# Altium footprint library THT.PcbLib: 60 footprints (part 1 of 4)
Each footprint in its own frame and in the unit in brackets; x right, y up, seen from the top. Pads: shape width x height; smd on the part's side, far side on the other; paste and mask are expansions set on the pad; w line width, h text height; cw(c..) or ccw(c..) is an arc to the next point about the centre after c.
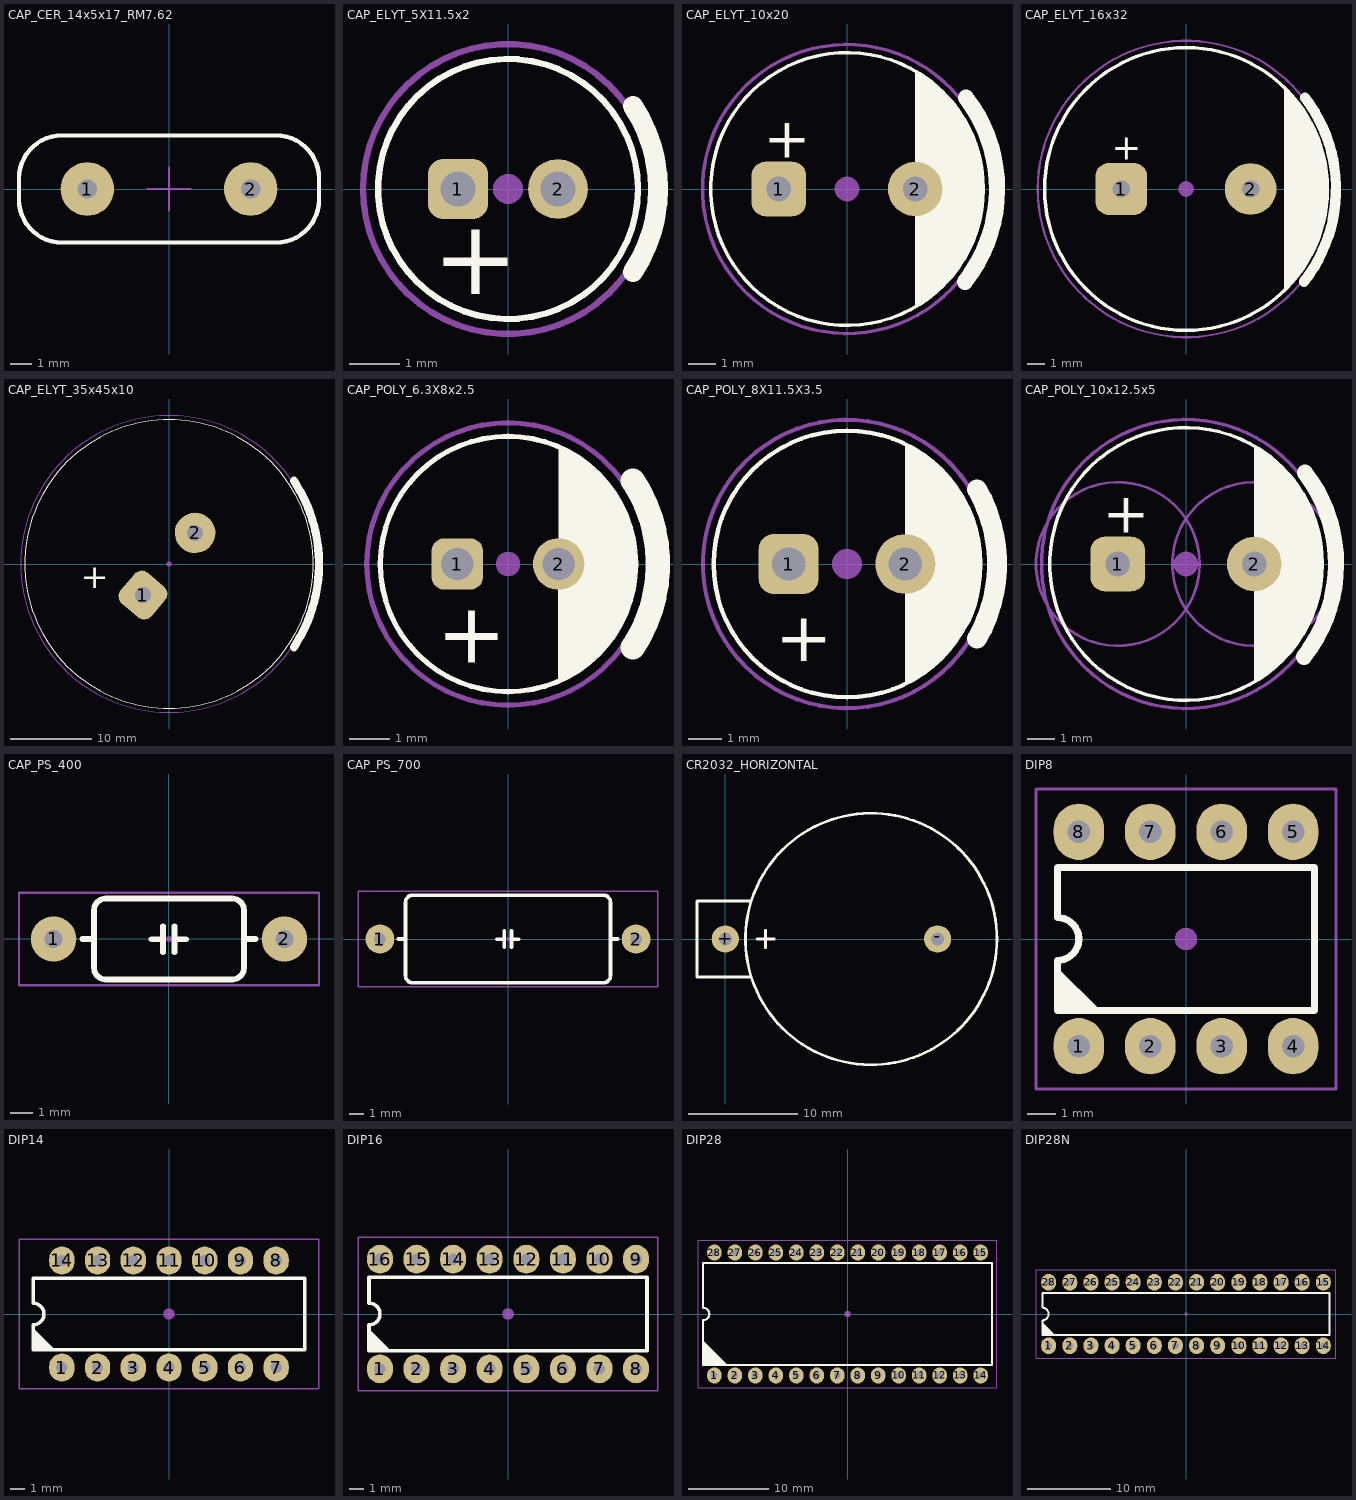
[diagram p0: the footprints below, top view; thin cyan lines are the x and y axes]

## CAP_CER_14x5x17_RM7.62 [mm] "Capacitor Radial Button, Pin spacing 7.62mm - Body Diameter  14mm X Body Width 5mm X Body Height 17mm"
height 17
pads (2):
  round 2.5 hole 0.9: 1(-3.81,0) 2(3.81,0)
Top Overlay:
  lines w0.2: -7,-0.5 ccw(c-5,-0.5) -5,-2.5 5,-2.5 ccw(c5,-0.5) 7,-0.5 7,0.5 ccw(c5,0.5) 5,2.5 -5,2.5 ccw(c-5,0.5) -7,0.5 -7,-0.5
Mechanical 8:
  lines w0.1: -4.81,0 -3.81,0 ; -3.81,-1 -3.81,0 ; -3.81,1 -3.81,0 ; -2.81,0 -3.81,0 ; -1,0 0,0 ; 0,-1 0,0 ; 0,1 0,0 ; 1,0 0,0 ; 2.81,0 3.81,0 ; 3.81,-1 3.81,0 ; 3.81,1 3.81,0 ; 4.81,0 3.81,0
Mechanical 14:
  lines w0.1: -7,-0.5 ccw(c-5,-0.5) -5,-2.5 5,-2.5 ccw(c5,-0.5) 7,-0.5 7,0.5 ccw(c5,0.5) 5,2.5 -5,2.5 ccw(c-5,0.5) -7,0.5 -7,-0.5
3D body "CAPRB_MURATA_DE2F3KY103MA3BM02.stp": height 17, standoff -3.6, extent -7,-2.5 7,2.5

## CAP_ELYT_5X11.5x2 [mm]
height 1.6
pads (2):
  rrect50% 1.2x1.2 / inner rrect50% 1.2x1.2 / far side rrect50% 1.4x2 hole 0.7: 1(-1,0)
  round 1.2 / inner round 1.2 / far side oval 1.4x2 hole 0.7: 2(1,0)
Top Overlay:
  circle w0.127: c0,0 r2.6
  lines w0.4: 2.496,-1.664 ccw(c0,0) 2.496,1.664
  text "+" at -1.5,-2.1 h1.5
Mechanical 15:
  circle w0.3: c0,0 r0.15
  circle w0.127: c0,0 r2.9
3D body "User Library-CE_R100_D200_H460.step": height 2.7, standoff -12.4, extent -2.54,-2.538 2.54,2.538

## CAP_ELYT_10x20 [mm]
pads (2):
  rrect50% 2x2 hole 0.9: 1(-2.5,0)
  round 2 hole 0.9: 2(2.5,0)
Top Overlay:
  circle w0.127: c0,0 r5
  region: 2.5,4.3 2.6,4.3 2.9,4.1 3.1,4 4,3.1 4,2.9 4.4,2.5 4.4,2.3 4.6,2.1 4.6,1.8 4.8,1.6 4.8,1.2 4.9,1.1 5,0.7 5,-0.7 4.9,-0.8 4.9,-1.2 4.8,-1.3 4.8,-1.6 4.6,-1.8 4.6,-2.1 4.4,-2.3 4.4,-2.5 4.3,-2.5 4.2,-2.6 4.2,-2.8 3.8,-3.2 3.8,-3.3 3.7,-3.3 2.9,-4.1 2.8,-4.1 2.5,-4.4
  lines w0.6: 4.325,-3.398 ccw(c0,0) 4.363,3.349
  text "+" at -3.048,1.143 h1.5
Mechanical 15:
  circle w0.127: c0,0 r5.3
  circle w0.5: c0,0 r0.2
3D body "User Library-CapAluRadial_D100H200.STEP": height 2.5, standoff -22.5, extent -5.25,-5.249 5.25,5.249

## CAP_ELYT_16x32 [mm]
pads (2):
  rrect50% 3x3 hole 1: 1(-3.75,0)
  round 3 hole 1: 2(3.75,0)
Top Overlay:
  circle w0.2: c0,0 r8.2
  region: 5.7,-5.9 5.892,-5.708 6.165,-5.435 6.657,-4.836 7.087,-4.192 7.452,-3.509 7.748,-2.794 7.973,-2.053 8.124,-1.293 8.2,-0.523 8.2,-0.135 8.2,0.284 8.118,1.118 7.954,1.941 7.711,2.744 7.39,3.518 6.994,4.258 6.529,4.955 5.997,5.603 5.7,5.9
  lines w0.6: 6.841,-5.375 ccw(c0,0) 6.902,5.297
  text "+" at -4.3,1.7 h1.5
Mechanical 15:
  circle w0.5: c0,0 r0.2
  circle w0.127: c0,0 r8.6
3D body "User Library-CapAluRadial_D160H315.STEP": height 2.5, standoff -34, extent -8.25,-8.25 8.25,8.25

## CAP_ELYT_35x45x10 [mm]
height 1.6
pads (2):
  rrect50% 5x5 hole 2 rot 50: 1(-3.214,-3.83)
  round 5 hole 2: 2(3.214,3.83)
Top Overlay:
  circle w0.127: c0,0 r17.8
  lines w1: 15.393,-10.262 ccw(c0,0) 15.393,10.262
  text "+" at -10.9,-3 h3
Mechanical 15:
  circle w0.127: c0,0 r18.301
  circle w0.3: c0,0 r0.15
3D body "User Library-Snap-in 35X45-P10.step": height 3.92, standoff -45.7, extent -17.78,-17.78 17.78,17.78

## CAP_POLY_6.3X8x2.5 [mm]
height 1.6
pads (2):
  rrect50% 1.27x1.27 / inner rrect50% 1.27x1.27 / far side rrect50% 1.778x1.778 hole 0.8: 1(-1.25,0)
  round 1.27 / inner round 1.27 / far side round 1.778 hole 0.8: 2(1.25,0)
Top Overlay:
  circle w0.127: c0,0 r3.15
  region: 1.25,2.89 1.295,2.845 1.397,2.845 1.524,2.718 1.626,2.718 1.803,2.54 1.905,2.54 2.54,1.905 2.54,1.803 2.743,1.6 2.743,1.473 2.896,1.321 2.896,1.194 2.997,1.092 2.997,0.813 3.124,0.686 3.124,-0.66 3.023,-0.762 3.023,-1.041 2.87,-1.194 2.87,-1.397 2.642,-1.626 2.642,-1.829 1.93,-2.54 1.803,-2.54 1.575,-2.769 1.422,-2.769 1.245,-2.946 1.27,-2.896 1.245,-2.87
  lines w0.6: 3.079,-2.052 ccw(c0,0) 3.079,2.052
  text "+" at -1.753,-2.438 h1.5
Mechanical 15:
  circle w0.127: c0,0 r3.483
  circle w0.3: c0,0 r0.15
3D body "User Library-CAPPR250-630x1000_100uF_16V.STEP": height 2.3, standoff -10.81, extent -3.15,-3.15 3.15,3.15

## CAP_POLY_8X11.5X3.5 [mm] "Polarized capacitors, Aluminum Electrolytic Capacitors, 2-Leads, Body 8x11.5x3.5x0.5"
height 11.5
pads (2):
  rrect50% 1.8x1.8 / inner rrect50% 1.4x1.4 / far side rrect50% 2.2x2.2 hole 1: 1(-1.75,0)
  round 1.8 / inner round 1.4 / far side round 2.2 hole 1: 2(1.75,0)
Top Overlay:
  circle w0.127: c0,0 r4
  region: 1.75,-3.556 1.778,-3.556 2.667,-3.048 3.302,-2.286 3.393,-2.184 3.553,-1.964 3.691,-1.729 3.806,-1.482 3.895,-1.225 3.959,-0.96 3.997,-0.69 4.008,-0.418 4,-0.282 4,0.282 3.999,0.439 3.966,0.752 3.903,1.06 3.81,1.361 3.687,1.651 3.537,1.927 3.361,2.188 3.16,2.429 3.048,2.54 2.667,3.048 1.778,3.556 1.771,3.549 1.761,3.534 1.754,3.516 1.75,3.498 1.75,3.488
  lines w0.6: 3.907,-2.233 ccw(c0,0) 3.907,2.233
  text "+" at -2.159,-2.921 h1.5
Mechanical 15:
  circle w0.5: c0,0 r0.2
  circle w0.127: c0,0 r4.326
3D body "User Library-CAPPR350-800x1150_270uF_16V.STEP": height 2.3, standoff -12.31, extent -4,-4 4,4

## CAP_POLY_10x12.5x5 [mm]
pads (2):
  rrect50% 2x2 hole 0.9: 1(-2.5,0)
  round 2 hole 0.9: 2(2.5,0)
Top Overlay:
  circle w0.127: c0,0 r5
  region: 2.5,4.3 2.6,4.3 2.9,4.1 3.1,4 4,3.1 4,2.9 4.4,2.5 4.4,2.3 4.6,2.1 4.6,1.8 4.8,1.6 4.8,1.2 4.9,1.1 5,0.7 5,-0.7 4.9,-0.8 4.9,-1.2 4.8,-1.3 4.8,-1.6 4.6,-1.8 4.6,-2.1 4.4,-2.3 4.4,-2.5 4.3,-2.5 4.2,-2.6 4.2,-2.8 3.8,-3.2 3.8,-3.3 3.7,-3.3 2.9,-4.1 2.8,-4.1 2.5,-4.4
  lines w0.6: 4.325,-3.398 ccw(c0,0) 4.363,3.349
  text "+" at -3.048,1.143 h1.5
Mechanical 2:
  circle w0.1: c-2.5,0 r3
  circle w0.1: c2.5,0 r3
Mechanical 15:
  circle w0.5: c0,0 r0.2
  circle w0.127: c0,0 r5.3
3D body "User Library-CAPPR500-1000x1200_330uF_16V.STEP": height 2.3, standoff -12.81, extent -5,-5 5,5

## CAP_PS_400 [mm]
pads (3):
  round 0.254 on Mech15: 0(0,0)
  round 2 hole 0.8: 1(-5.08,0) 2(5.08,0)
Top Overlay:
  lines w0.254: -3.81,0 -3.302,0 ; -0.773,-0.013 -0.265,-0.013 ; -0.265,-0.584 -0.265,0.559 ; 0.243,-0.584 0.243,0.559 ; 0.243,-0.013 0.751,-0.013 ; 3.81,0 3.302,0 ; 3.302,0 3.302,1.27 ccw(c2.794,1.27) 2.794,1.778 -2.794,1.778 ccw(c-2.794,1.27) -3.302,1.27 -3.302,-1.27 ccw(c-2.794,-1.27) -2.794,-1.778 2.794,-1.778 ccw(c2.794,-1.27) 3.302,-1.27 3.302,0
Mechanical 15:
  lines w0.1: -6.604,-2.032 -6.604,2.032 6.604,2.032 6.604,-2.032 -4.826,-2.032 -6.604,-2.032
3D body "User Library-Capacitor no pol axial 0_4in pitch.step": height 3.42, standoff -4.4, extent -5.335,-1.609 5.335,1.609

## CAP_PS_700 [mm]
pads (3):
  round 0.254 on Mech15: 0(0,0)
  round 2 hole 0.8: 1(-8.89,0) 2(8.89,0)
Top Overlay:
  lines w0.254: -7.62,0 -7.112,0 ; -0.773,-0.013 -0.265,-0.013 ; -0.265,-0.584 -0.265,0.559 ; 0.243,-0.584 0.243,0.559 ; 0.243,-0.013 0.751,-0.013 ; 7.62,0 7.112,0 ; 7.112,0 7.112,2.54 ccw(c6.604,2.54) 6.604,3.048 -6.604,3.048 ccw(c-6.604,2.54) -7.112,2.54 -7.112,-2.54 ccw(c-6.604,-2.54) -6.604,-3.048 6.604,-3.048 ccw(c6.604,-2.54) 7.112,-2.54 7.112,0
Mechanical 15:
  lines w0.1: -10.414,-3.302 10.414,-3.302 10.414,3.302 -10.414,3.302 -10.414,-2.032 -10.414,-3.302
3D body "PS_cap700.STEP": height 6.2, standoff -1.8, extent -9.14,-3.003 9.14,2.997

## CR2032_HORIZONTAL [mm]
pads (2):
  round 2.5 hole 1.2: +(0,0) -(19.5,0)
Top Overlay:
  circle w0.254: c13.4,0 r11.555
  lines w0.254: 2.3,-3.5 -2.6,-3.5 -2.6,3.5 2.3,3.5 ; 2.9,0 4.5,0 ; 3.7,-0.8 3.7,0 ; 3.7,0.8 3.7,0 ; 3.8,0 3.7,0
3D body "User Library-CH25-2032.step": height 8.43, standoff -2.97, extent -2.6,-11.399 24.9,11.4

## DIP8 [mm]
pads (8):
  oval 1.8x2 hole 0.8: 1(-3.81,-3.81) 2(-1.27,-3.81) 3(1.27,-3.81) 4(3.81,-3.81) 5(3.81,3.81) 6(1.27,3.81) 7(-1.27,3.81) 8(-3.81,3.81)
Top Overlay:
  region: -4.572,-1.016 -3.048,-2.54 -4.572,-2.54
  lines w0.254: -4.572,-2.54 -4.572,-0.762 ccw(c-4.572,0) -4.572,0.762 -4.572,2.54 4.572,2.54 4.572,-2.54 -4.572,-2.54
Mechanical 15:
  circle w0.4: c0,0 r0.199
  lines w0.1: -5.334,-5.334 5.334,-5.334 5.334,5.334 -5.334,5.334 -5.334,-5.334
3D body "User Library-DIP-8P-M01.step": height 4.36, standoff -3, extent -4.7,-3.935 4.7,3.935

## DIP14 [mm]
pads (14):
  oval 1.8x2 hole 0.8: 1(-7.62,-3.81) 2(-5.08,-3.81) 3(-2.54,-3.81) 4(0,-3.81) 5(2.54,-3.81) 6(5.08,-3.81) 7(7.62,-3.81) 8(7.62,3.81) 9(5.08,3.81) 10(2.54,3.81) 11(0,3.81) 12(-2.54,3.81) 13(-5.08,3.81) 14(-7.62,3.81)
Top Overlay:
  region: -9.652,-1.016 -8.128,-2.54 -9.652,-2.54
  lines w0.254: -9.652,-2.54 9.652,-2.54 9.652,2.54 -9.652,2.54 -9.652,0.762 cw(c-9.652,0) -9.652,-0.762 -9.652,-2.54
Mechanical 15:
  circle w0.4: c0,0 r0.199
  lines w0.1: -10.668,-5.334 10.668,-5.334 10.668,5.334 1.524,5.334 -10.668,5.334 -10.668,-5.334
3D body "User Library-DIP-14P-M02.step": height 4.36, standoff -3, extent -9.8,-3.935 9.8,3.935

## DIP16 [mm]
pads (16):
  oval 1.8x2 hole 0.8: 1(-8.89,-3.81) 2(-6.35,-3.81) 3(-3.81,-3.81) 4(-1.27,-3.81) 5(1.27,-3.81) 6(3.81,-3.81) 7(6.35,-3.81) 8(8.89,-3.81) 9(8.89,3.81) 10(6.35,3.81) 11(3.81,3.81) 12(1.27,3.81) 13(-1.27,3.81) 14(-3.81,3.81) 15(-6.35,3.81) 16(-8.89,3.81)
Top Overlay:
  region: -9.652,-1.016 -8.128,-2.54 -9.652,-2.54
  lines w0.254: -9.652,-2.54 -9.652,-0.762 ccw(c-9.652,0) -9.652,0.762 -9.652,2.54 9.652,2.54 9.652,-2.54 -9.652,-2.54
Mechanical 15:
  circle w0.4: c0,0 r0.199
  lines w0.1: -10.414,-5.334 -10.414,5.334 0.254,5.334 10.414,5.334 10.414,-5.334 -10.414,-5.334
3D body "User Library-DIP-16P-M03.step": height 4.66, standoff -3, extent -9.7,-3.935 9.7,3.935

## DIP28 [mm]
pads (28):
  oval 1.8x2 hole 0.8: 1(-16.51,-7.62) 2(-13.97,-7.62) 3(-11.43,-7.62) 4(-8.89,-7.62) 5(-6.35,-7.62) 6(-3.81,-7.62) 7(-1.27,-7.62) 8(1.27,-7.62) 9(3.81,-7.62) 10(6.35,-7.62) 11(8.89,-7.62) 12(11.43,-7.62) 13(13.97,-7.62) 14(16.51,-7.62) 15(16.51,7.62) 16(13.97,7.62) 17(11.43,7.62) 18(8.89,7.62) 19(6.35,7.62) 20(3.81,7.62) 21(1.27,7.62) 22(-1.27,7.62) 23(-3.81,7.62) 24(-6.35,7.62) 25(-8.89,7.62) 26(-11.43,7.62) 27(-13.97,7.62) 28(-16.51,7.62)
Top Overlay:
  region: -17.907,-3.302 -14.859,-6.35 -17.907,-6.35
  lines w0.254: -17.907,-6.35 -17.907,-0.762 ccw(c-17.907,0) -17.907,0.762 -17.907,6.35 17.907,6.35 17.907,-6.35 -17.907,-6.35
Mechanical 15:
  circle w0.4: c0,0 r0.199
  lines w0.1: -18.542,-9.144 -18.542,9.144 18.542,9.144 18.542,-9.144 -18.542,-9.144
3D body "User Library-DIP-28P-M05.step": height 5, standoff -3, extent -17.9,-7.745 17.9,7.745

## DIP28N [mm]
pads (28):
  oval 1.8x2 hole 0.8: 1(-16.51,-3.81) 2(-13.97,-3.81) 3(-11.43,-3.81) 4(-8.89,-3.81) 5(-6.35,-3.81) 6(-3.81,-3.81) 7(-1.27,-3.81) 8(1.27,-3.81) 9(3.81,-3.81) 10(6.35,-3.81) 11(8.89,-3.81) 12(11.43,-3.81) 13(13.97,-3.81) 14(16.51,-3.81) 15(16.51,3.81) 16(13.97,3.81) 17(11.43,3.81) 18(8.89,3.81) 19(6.35,3.81) 20(3.81,3.81) 21(1.27,3.81) 22(-1.27,3.81) 23(-3.81,3.81) 24(-6.35,3.81) 25(-8.89,3.81) 26(-11.43,3.81) 27(-13.97,3.81) 28(-16.51,3.81)
Top Overlay:
  region: -17.272,-1.016 -15.748,-2.54 -17.272,-2.54
  lines w0.254: -17.272,-2.54 -17.272,-0.762 ccw(c-17.272,0) -17.272,0.762 -17.272,2.54 17.272,2.54 17.272,-2.54 -17.272,-2.54
Mechanical 15:
  circle w0.254: c0,0 r0.076
  lines w0.1: -18.034,-5.334 18.034,-5.334 18.034,5.334 -7.366,5.334 -18.034,5.334 -18.034,-5.334
3D body "User Library-DIP-28P-M04.step": height 5.2, standoff -3, extent -17.7,-3.935 17.7,3.935